# Altium footprint library qfuse_pcb_lib.PcbLib: 37 footprints (part 2 of 3)
Each footprint in its own frame and in the unit in brackets; x right, y up, seen from the top. Pads: shape width x height; smd on the part's side, far side on the other; paste and mask are expansions set on the pad; w line width, h text height; cw(c..) or ccw(c..) is an arc to the next point about the centre after c.
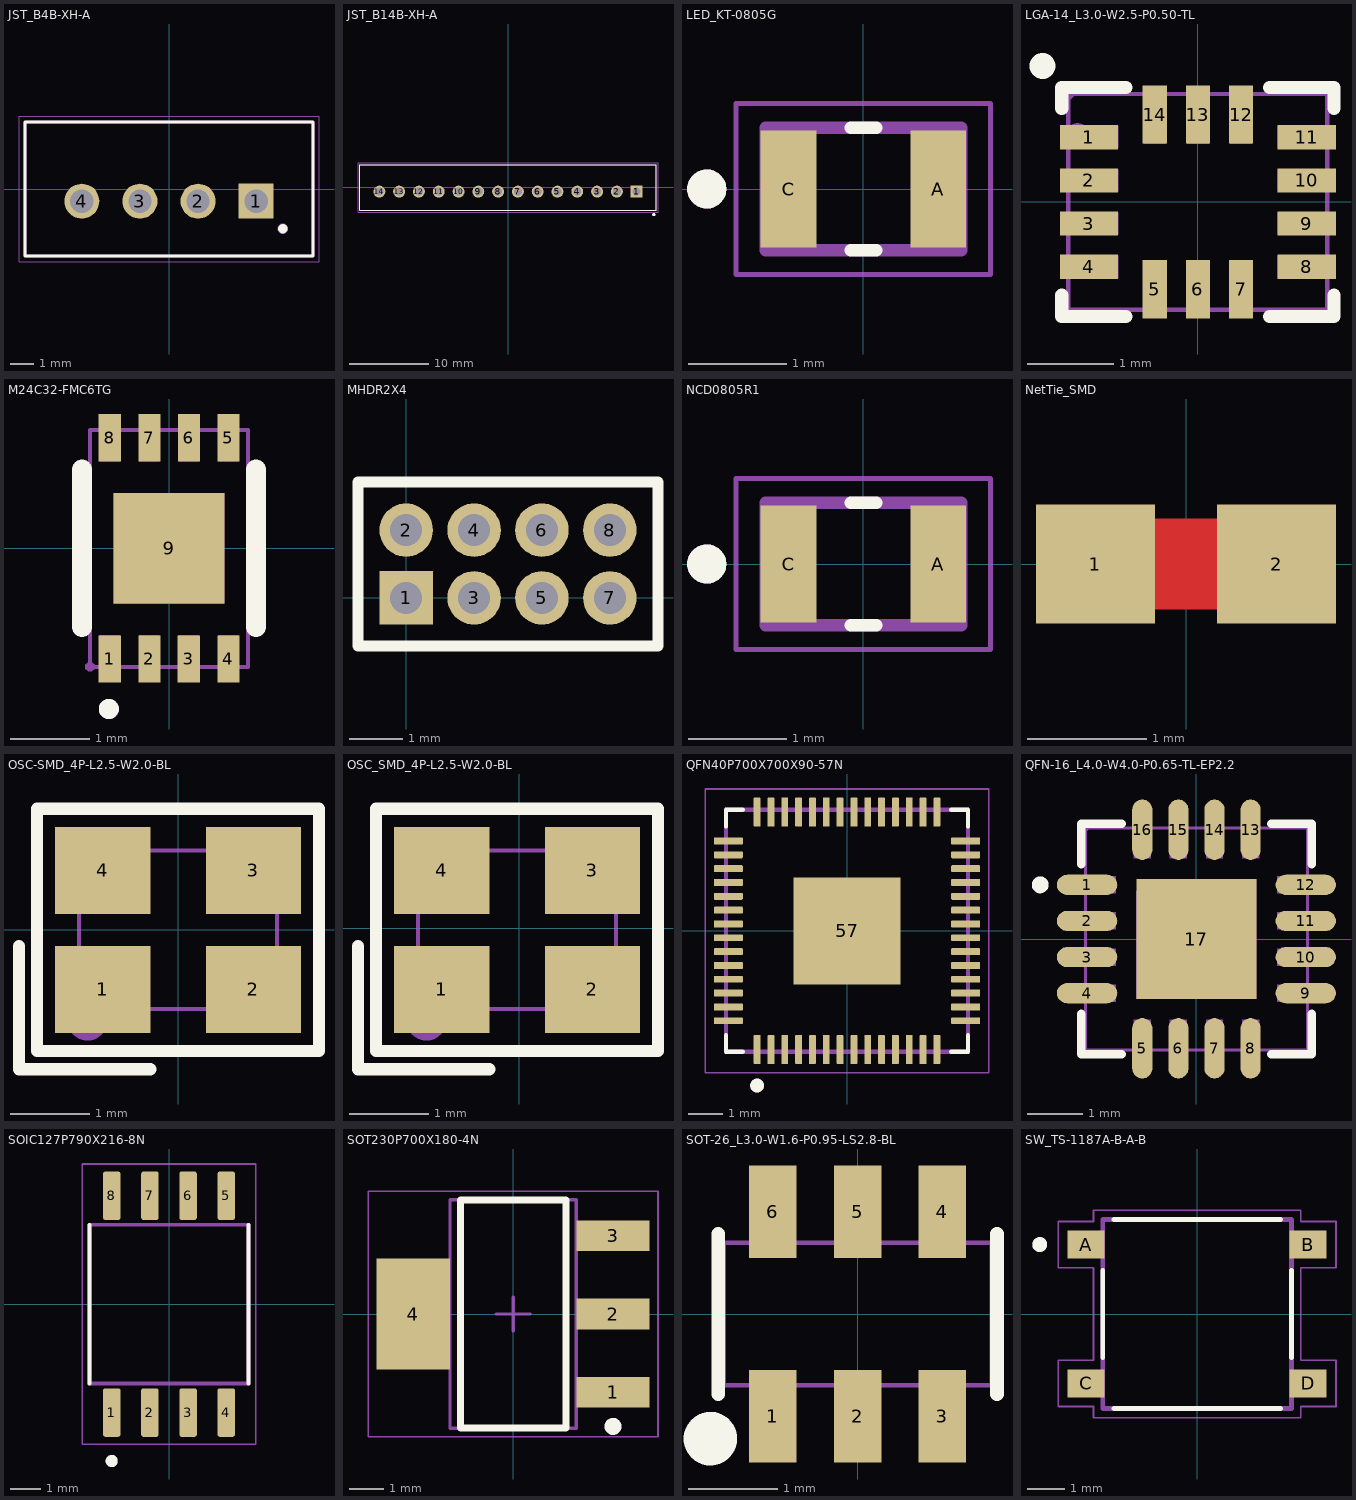
[diagram p1: the footprints below, top view; thin cyan lines are the x and y axes]

## JST_B4B-XH-A [mm] "JST 4 Pin Single Row Header"
height 7
pads (4):
  rect 1.508x1.508 / inner round 1.508 / far side rect 1.508x1.508 hole 1: 1(3.75,-0.525)
  round 1.508 hole 1: 2(1.25,-0.525) 3(-1.25,-0.525) 4(-3.75,-0.525)
Top Overlay:
  circle w0.2: c4.894,-1.706 r0.1
  lines w0.127: -6.2,-2.875 -6.2,2.875 6.2,2.875 6.2,-2.875 -6.2,-2.875
Mechanical 13:
  circle w0.2: c4.894,-1.706 r0.127
  lines w0.127: -6.2,-2.875 -6.2,2.875 6.2,2.875 6.2,-2.875 -6.2,-2.875
Mechanical 15:
  lines w0.05: -6.45,-3.125 -6.45,3.125 6.45,3.125 6.45,-3.125 -6.45,-3.125
3D body "step_temp.STEP": height 7, standoff -3.4, extent -6.2,-2.875 6.2,2.875

## JST_B14B-XH-A [mm] "JST 14 Pin Single Row Header"
height 7
pads (14):
  rect 1.508x1.508 / inner round 1.508 / far side rect 1.508x1.508 hole 1: 1(16.25,-0.525)
  round 1.508 hole 1: 2(13.75,-0.525) 3(11.25,-0.525) 4(8.75,-0.525) 5(6.25,-0.525) 6(3.75,-0.525) 7(1.25,-0.525) 8(-1.25,-0.525) 9(-3.75,-0.525) 10(-6.25,-0.525) 11(-8.75,-0.525) 12(-11.25,-0.525) 13(-13.75,-0.525) 14(-16.25,-0.525)
Top Overlay:
  circle w0.2: c18.415,-3.429 r0.1
  lines w0.127: -18.7,-2.875 18.7,-2.875 18.7,2.875 -18.7,2.875 -18.7,-2.875
Mechanical 13:
  circle w0.2: c18.415,-3.429 r0.1
  lines w0.127: -18.7,-2.875 18.7,-2.875 18.7,2.875 -18.7,2.875 -18.7,-2.875
Mechanical 15:
  lines w0.05: -18.95,-3.125 18.95,-3.125 18.95,3.125 -18.95,3.125 -18.95,-3.125
3D body "step_temp.STEP": height 7, standoff -3.4, extent -18.7,-2.875 18.7,2.875

## LED_KT-0805G [mm]
height 0.8
pads (2):
  rect 0.57x1.2 smd: A(0.765,0) C(-0.765,0)
Top Overlay:
  circle w0.2: c-1.6,0 r0.1
  lines w0.127: -0.13,-0.625 0.13,-0.625 ; -0.13,0.625 0.13,0.625
Mechanical 13:
  circle w0.2: c-1.6,0 r0.1
  lines w0.127: -1,-0.625 1,-0.625 1,0.625 -1,0.625 -1,-0.625
Mechanical 15:
  lines w0.05: -1.3,-0.875 1.3,-0.875 1.3,0.875 -1.3,0.875 -1.3,-0.875
3D body "step_temp.STEP": height 0.8, standoff 0, extent -1,-0.625 1,0.625

## LGA-14_L3.0-W2.5-P0.50-TL [mm]
pads (14):
  rect 0.675x0.28 smd paste+0 mask+0.051: 1(-1.262,0.75) 2(-1.262,0.25) 3(-1.262,-0.25) 4(-1.262,-0.75) 8(1.262,-0.75) 9(1.262,-0.25) 10(1.262,0.25) 11(1.262,0.75)
  rect 0.28x0.675 smd paste+0 mask+0.051: 5(-0.5,-1.012) 6(0,-1.012) 7(0.5,-1.012) 12(0.5,1.012) 13(0,1.012) 14(-0.5,1.012)
Top Overlay:
  circle w0.15: c-1.8,1.575 r0.075
  lines w0.152: -1.576,-1.08 -1.576,-1.326 -0.831,-1.326 ; -1.576,1.08 -1.576,1.326 -0.831,1.326 ; 0.83,-1.326 1.576,-1.326 1.576,-1.08 ; 0.83,1.326 1.576,1.326 1.576,1.08
Mechanical 6:
  circle w0.15: c-1.397,0.762 r0.075
Mechanical 15:
  region: -1.4,0.875 -0.925,0.875 -0.925,0.625 -1.4,0.625
  region: -1.4,0.375 -0.925,0.375 -0.925,0.125 -1.4,0.125
  region: -1.4,-0.125 -0.925,-0.125 -0.925,-0.375 -1.4,-0.375
  region: -1.4,-0.625 -0.925,-0.625 -0.925,-0.875 -1.4,-0.875
  region: -0.625,-0.675 -0.375,-0.675 -0.375,-1.15 -0.625,-1.15
  region: -0.125,-0.675 0.125,-0.675 0.125,-1.15 -0.125,-1.15
  region: 0.375,-0.675 0.625,-0.675 0.625,-1.15 0.375,-1.15
  region: 0.925,-0.625 1.4,-0.625 1.4,-0.875 0.925,-0.875
  region: 0.925,-0.125 1.4,-0.125 1.4,-0.375 0.925,-0.375
  region: 0.925,0.375 1.4,0.375 1.4,0.125 0.925,0.125
  region: 0.925,0.875 1.4,0.875 1.4,0.625 0.925,0.625
  region: 0.375,1.15 0.625,1.15 0.625,0.675 0.375,0.675
  region: -0.125,1.15 0.125,1.15 0.125,0.675 -0.125,0.675
  region: -0.625,1.15 -0.375,1.15 -0.375,0.675 -0.625,0.675
  region: -1.44,1.25 -1.44,1.275 -1.475,1.31 -1.525,1.31 -1.56,1.275 -1.56,1.25 -1.56,1.225 -1.525,1.19 -1.475,1.19 -1.44,1.225
  lines w0.051: -1.5,-1.25 -1.5,1.25 1.5,1.25 1.5,-1.25 -1.5,-1.25
3D body "LGA14_2P5X3X0P91_TDK.step": height 0.97, standoff 0, extent -1.499,-1.245 1.499,1.245

## M24C32-FMC6TG [mm]
pads (9):
  rect 0.28x0.6 smd mask+0.05: 1(-0.75,-1.399) 2(-0.248,-1.399) 3(0.25,-1.399) 4(0.752,-1.399) 5(0.752,1.401) 6(0.251,1.401) 7(-0.248,1.401) 8(-0.75,1.401)
  rect 1.4x1.4 smd: 9(0,0)
Top Overlay:
  circle w0.127: c-0.762,-2.032 r0.064
  lines w0.254: -1.1,-0.997 -1.1,0.997 ; 1.1,-0.995 1.1,0.999
Mechanical 6:
  circle w0.127: c-0.762,-2.032 r0.064
Mechanical 15:
  region: -0.625,-1.499 -0.875,-1.499 -0.875,-1.099 -0.625,-1.099
  region: -0.123,-1.499 -0.373,-1.499 -0.373,-1.099 -0.123,-1.099
  region: 0.375,-1.499 0.125,-1.499 0.125,-1.099 0.375,-1.099
  region: 0.877,-1.499 0.627,-1.499 0.627,-1.099 0.877,-1.099
  region: 0.877,1.101 0.627,1.101 0.627,1.501 0.877,1.501
  region: 0.376,1.101 0.126,1.101 0.126,1.501 0.376,1.501
  region: -0.123,1.101 -0.373,1.101 -0.373,1.501 -0.123,1.501
  region: -0.625,1.101 -0.875,1.101 -0.875,1.501 -0.625,1.501
  region: 0.7,0.7 0.7,-0.7 -0.7,-0.7 -0.7,0.7
  region: -0.939,-1.499 -0.94,-1.474 -0.975,-1.44 -1.024,-1.44 -1.059,-1.474 -1.059,-1.499 -1.059,-1.523 -1.024,-1.558 -0.975,-1.558 -0.94,-1.523
  lines w0.051: -0.999,-1.499 1.001,-1.499 1.001,1.501 -0.999,1.501 -0.999,-1.499
3D body "DFPN_MC6TG_STM.step": height 0.61, standoff 0, extent -1.013,-1.549 0.993,1.549

## MHDR2X4 [mm] "Connector; Header; 4x2 Position"
pads (8):
  rect 1x1 hole 0.6: 1(0,0)
  round 1 hole 0.6: 2(0,1.27) 3(1.27,0) 4(1.27,1.27) 5(2.54,0) 6(2.54,1.27) 7(3.81,0) 8(3.81,1.27)
Top Overlay:
  lines w0.2: -0.9,-0.9 4.71,-0.9 4.71,2.17 -0.9,2.17 -0.9,-0.9

## NCD0805R1 [mm]
height 0.8
pads (2):
  rect 0.57x1.2 smd: A(0.765,0) C(-0.765,0)
Top Overlay:
  circle w0.2: c-1.6,0 r0.1
  lines w0.127: -0.13,-0.625 0.13,-0.625 ; -0.13,0.625 0.13,0.625
Mechanical 13:
  circle w0.2: c-1.6,0 r0.1
  lines w0.127: -1,-0.625 -1,0.625 1,0.625 1,-0.625 -1,-0.625
Mechanical 15:
  lines w0.05: -1.3,-0.875 -1.3,0.875 1.3,0.875 1.3,-0.875 -1.3,-0.875
3D body "step_temp.STEP": height 0.8, standoff 0, extent -1,-0.625 1,0.625

## NetTie_SMD [mm]
pads (2):
  rect 1x1 smd mask-10: 1(-0.762,0) 2(0.762,0)
Top Layer:
  rectangle: -0.381,-0.381 0.381,0.381

## OSC-SMD_4P-L2.5-W2.0-BL [mm]
pads (4):
  rect 1.2x1.1 smd paste+0 mask+0.051: 1(-0.95,-0.75) 2(0.95,-0.75) 3(0.95,0.75) 4(-0.95,0.75)
Top Overlay:
  lines w0.152: -2.007,-0.201 -2.007,-1.758 -0.351,-1.758 ; -1.779,-1.529 -1.779,1.529 1.779,1.529 1.779,-1.529 -1.779,-1.529
Mechanical 6:
  circle w0.254: c-1.143,-1.143 r0.127
  region: -1.143,0.635 -0.635,0.635 -0.635,0.508 -1.143,0.508
  region: -0.953,0.318 -0.953,0.826 -0.826,0.826 -0.826,0.318
  region: 0.635,-0.635 1.143,-0.635 1.143,-0.762 0.635,-0.762
Mechanical 15:
  region: -1.19,-1 -1.19,-0.976 -1.225,-0.941 -1.274,-0.941 -1.309,-0.976 -1.31,-1 -1.309,-1.024 -1.274,-1.059 -1.225,-1.059 -1.19,-1.024
  region: -1.25,1 -0.45,1 -0.45,0.325 -1.25,0.325
  region: -0.45,-1 -1.25,-1 -1.25,-0.325 -0.45,-0.325
  region: 1.25,0.325 0.45,0.325 0.45,1 1.25,1
  region: 1.25,-1 0.45,-1 0.45,-0.325 1.25,-0.325
  lines w0.051: -1.25,-1 -1.25,1 1.25,1 1.25,-1 -1.25,-1
3D body "2520 SMD Crystal Oscillator.STEP": height 0.65, standoff -0.05, extent -1.25,-1 1.25,1

## OSC_SMD_4P-L2.5-W2.0-BL [mm]
pads (4):
  rect 1.2x1.1 smd paste+0 mask+0.051: 1(-0.975,-0.77) 2(0.925,-0.77) 3(0.925,0.73) 4(-0.975,0.73)
Top Overlay:
  lines w0.152: -2.032,-0.221 -2.032,-1.778 -0.376,-1.778 ; -1.804,-1.549 1.753,-1.549 1.753,1.508 -1.804,1.508 -1.804,-1.549
Mechanical 6:
  circle w0.254: c-1.168,-1.163 r0.127
  region: 0.61,-0.655 1.118,-0.655 1.118,-0.782 0.61,-0.782
  region: -0.978,0.297 -0.978,0.805 -0.851,0.805 -0.851,0.297
  region: -1.168,0.615 -0.66,0.615 -0.66,0.488 -1.168,0.488
Mechanical 15:
  region: 1.225,-1.02 0.425,-1.02 0.425,-0.345 1.225,-0.345
  region: 1.225,0.305 0.425,0.305 0.425,0.98 1.225,0.98
  region: -0.475,-1.02 -1.275,-1.02 -1.275,-0.345 -0.475,-0.345
  region: -1.275,0.98 -0.475,0.98 -0.475,0.305 -1.275,0.305
  region: -1.215,-1.02 -1.216,-0.996 -1.251,-0.962 -1.3,-0.962 -1.335,-0.996 -1.335,-1.02 -1.335,-1.045 -1.3,-1.079 -1.251,-1.079 -1.216,-1.045
  lines w0.051: -1.275,-1.02 1.225,-1.02 1.225,0.98 -1.275,0.98 -1.275,-1.02
3D body "2520 SMD Crystal Oscillator.STEP": height 0.65, standoff -0.05, extent -1.275,-1.025 1.225,0.975

## QFN40P700X700X90-57N [mm]
pads (57):
  rrect25% 0.2x0.84 smd: 1(-2.6,-3.435) 2(-2.2,-3.435) 3(-1.8,-3.435) 4(-1.4,-3.435) 5(-1,-3.435) 6(-0.6,-3.435) 7(-0.2,-3.435) 8(0.2,-3.435) 9(0.6,-3.435) 10(1,-3.435) 11(1.4,-3.435) 12(1.8,-3.435) 13(2.2,-3.435) 14(2.6,-3.435) 29(2.6,3.435) 30(2.2,3.435) 31(1.8,3.435) 32(1.4,3.435) 33(1,3.435) 34(0.6,3.435) 35(0.2,3.435) 36(-0.2,3.435) 37(-0.6,3.435) 38(-1,3.435) 39(-1.4,3.435) 40(-1.8,3.435) 41(-2.2,3.435) 42(-2.6,3.435)
  rrect25% 0.84x0.2 smd: 15(3.435,-2.6) 16(3.435,-2.2) 17(3.435,-1.8) 18(3.435,-1.4) 19(3.435,-1) 20(3.435,-0.6) 21(3.435,-0.2) 22(3.435,0.2) 23(3.435,0.6) 24(3.435,1) 25(3.435,1.4) 26(3.435,1.8) 27(3.435,2.2) 28(3.435,2.6) 43(-3.435,2.6) 44(-3.435,2.2) 45(-3.435,1.8) 46(-3.435,1.4) 47(-3.435,1) 48(-3.435,0.6) 49(-3.435,0.2) 50(-3.435,-0.2) 51(-3.435,-0.6) 52(-3.435,-1) 53(-3.435,-1.4) 54(-3.435,-1.8) 55(-3.435,-2.2) 56(-3.435,-2.6)
  rect 3.1x3.1 smd paste-0.57: 57(0,0)
Top Overlay:
  circle w0.2: c-2.6,-4.475 r0.1
  lines w0.127: -3.5,-3.02 -3.5,-3.5 -3.02,-3.5 ; -3.5,3.02 -3.5,3.5 -3.02,3.5 ; 3.02,-3.5 3.5,-3.5 3.5,-3.02 ; 3.02,3.5 3.5,3.5 3.5,3.02
Mechanical 13:
  circle w0.2: c-2.6,-4.475 r0.1
  lines w0.127: -3.5,-3.5 -3.5,3.5 3.5,3.5 3.5,-3.5 -3.5,-3.5
Mechanical 15:
  lines w0.05: -4.105,-4.105 -4.105,4.105 4.105,4.105 4.105,-4.105 -4.105,-4.105
3D body "RP2040--3DModel-STEP-269445.STEP": height 0.9, standoff 0, extent -3.5,-3.5 3.5,3.5

## QFN-16_L4.0-W4.0-P0.65-TL-EP2.2 [mil]
pads (17):
  oval 42.8x14.33 smd paste+0 mask+2: 1(-77.5,38.39) 2(-77.5,12.79) 3(-77.5,-12.8) 4(-77.5,-38.39) 9(77.5,-38.39) 10(77.5,-12.8) 11(77.5,12.79) 12(77.5,38.39)
  oval 14.33x42.8 smd paste+0 mask+2: 5(-38.39,-77.5) 6(-12.79,-77.5) 7(12.8,-77.5) 8(38.39,-77.5) 13(38.39,77.5) 14(12.8,77.5) 15(-12.79,77.5) 16(-38.39,77.5)
  rect 85.04x85.04 smd paste+0 mask+2: 17(0,0)
Top Overlay:
  circle w6: c-110.71,38.39 r3
  lines w6: -81.74,-53.05 -81.74,-81.74 -53.05,-81.74 ; -81.74,53.05 -81.74,81.74 -53.05,81.74 ; 53.05,-81.74 81.74,-81.74 81.74,-53.05 ; 53.05,81.74 81.74,81.74 81.74,53.05
Mechanical 6:
  circle w6: c-90.55,38.39 r3
Mechanical 15:
  region: -76.38,78.74 -76.4,79.7 -77.77,81.05 -79.7,81.05 -81.08,79.71 -81.1,78.74 -81.08,77.78 -79.7,76.43 -77.78,76.43 -76.4,77.78
  region: -78.74,44.39 -57.09,44.39 -57.09,32.38 -78.74,32.38
  region: -78.74,18.8 -57.09,18.8 -57.09,6.79 -78.74,6.79
  region: -78.74,-6.79 -57.09,-6.79 -57.09,-18.8 -78.74,-18.8
  region: -78.74,-32.38 -57.09,-32.38 -57.09,-44.39 -78.74,-44.39
  region: -44.39,-57.09 -32.38,-57.09 -32.38,-78.74 -44.39,-78.74
  region: -18.8,-57.09 -6.79,-57.09 -6.79,-78.74 -18.8,-78.74
  region: 6.79,-57.09 18.8,-57.09 18.8,-78.74 6.79,-78.74
  region: 32.38,-57.09 44.39,-57.09 44.39,-78.74 32.38,-78.74
  region: 78.74,-32.38 57.09,-32.38 57.09,-44.39 78.74,-44.39
  region: 78.74,-6.79 57.09,-6.79 57.09,-18.8 78.74,-18.8
  region: 78.74,18.8 57.09,18.8 57.09,6.79 78.74,6.79
  region: 78.74,44.39 57.09,44.39 57.09,32.38 78.74,32.38
  region: 32.38,57.09 44.39,57.09 44.39,78.74 32.38,78.74
  region: 6.79,57.09 18.8,57.09 18.8,78.74 6.79,78.74
  region: -18.8,57.09 -6.79,57.09 -6.79,78.74 -18.8,78.74
  region: -44.39,57.09 -32.38,57.09 -32.38,78.74 -44.39,78.74
  region: -34.02,42.52 42.52,42.52 42.52,-42.52 -42.52,-42.52 -42.52,34.02
  lines w2: -78.74,-78.74 78.74,-78.74 78.74,78.74 -78.74,78.74 -78.74,-78.74
3D body "RGV0016A.stp": height 39.37, standoff 0, extent -78.74,-78.74 78.74,78.74

## SOIC127P790X216-8N [mm]
pads (8):
  rrect25% 0.58x1.61 smd: 1(-1.905,-3.605) 2(-0.635,-3.605) 3(0.635,-3.605) 4(1.905,-3.605) 5(1.905,3.605) 6(0.635,3.605) 7(-0.635,3.605) 8(-1.905,3.605)
Top Overlay:
  circle w0.2: c-1.905,-5.215 r0.1
  lines w0.127: -2.64,-2.64 -2.64,2.64 ; 2.64,-2.64 2.64,2.64
Mechanical 13:
  circle w0.2: c-1.905,-5.215 r0.1
  lines w0.127: -2.64,-2.64 -2.64,2.64 2.64,2.64 2.64,-2.64 -2.64,-2.64
Mechanical 15:
  lines w0.05: -2.89,-4.66 -2.89,4.66 2.89,4.66 2.89,-4.66 -2.89,-4.66
3D body "SOIC_208MIL_WIN.step": height 2.16, standoff 0, extent -2.692,-4.051 2.692,4.051

## SOT230P700X180-4N [mm] "SOT223, 4-Leads, Body 6.51x7.00mm (avg), Pitch 2.30mm, IPC Medium Density"
height 1.8
pads (4):
  rect 2.15x0.9 smd: 1(2.93,-2.3) 2(2.93,0) 3(2.93,2.3)
  rect 2.15x3.25 smd: 4(-2.93,0)
Top Overlay:
  circle w0.25: c2.93,-3.3 r0.125
  lines w0.2: -1.55,-3.35 -1.55,3.35 1.55,3.35 1.55,-3.35 -1.55,-3.35
Mechanical 13:
  lines w0.1: -1.855,-3.355 -1.855,3.355 1.855,3.355 1.855,-3.355 -1.855,-3.355
Mechanical 15:
  lines w0.05: -4.25,-3.6 -4.25,3.6 4.25,3.6 4.25,-3.6 -4.25,-3.6
  lines w0.1: -0.5,0 0.5,0 ; 0,-0.5 0,0.5
3D body: height 1.8, standoff 0.02, extent -1.855,-3.355 1.855,3.355

## SOT-26_L3.0-W1.6-P0.95-LS2.8-BL [mm]
pads (6):
  rect 0.532x1.04 smd paste+0 mask+0.051: 1(-0.95,-1.145) 2(0,-1.145) 3(0.95,-1.145) 4(0.95,1.145) 5(0,1.145) 6(-0.95,1.145)
Top Overlay:
  circle w0.3: c-1.651,-1.397 r0.15
  lines w0.152: -1.561,-0.901 -1.561,0.901 ; 1.561,-0.901 1.561,0.901
Mechanical 6:
  circle w0.2: c-1.651,-1.397 r0.1
Mechanical 15:
  region: 1.15,0.75 0.75,0.75 0.75,1.035 1.15,1.035
  region: 0.2,0.75 -0.2,0.75 -0.2,1.035 0.2,1.035
  region: -0.75,0.75 -1.15,0.75 -1.15,1.035 -0.75,1.035
  region: -1.15,-0.75 -0.75,-0.75 -0.75,-1.035 -1.15,-1.035
  region: -0.2,-0.75 0.2,-0.75 0.2,-1.035 -0.2,-1.035
  region: -1.15,1.025 -0.75,1.025 -0.75,1.425 -1.15,1.425
  region: -0.2,1.025 0.2,1.025 0.2,1.425 -0.2,1.425
  region: 0.75,1.025 1.15,1.025 1.15,1.425 0.75,1.425
  region: 0.75,-0.75 1.15,-0.75 1.15,-1.035 0.75,-1.035
  region: 0.75,-1.025 1.15,-1.025 1.15,-1.425 0.75,-1.425
  region: -0.2,-1.025 0.2,-1.025 0.2,-1.425 -0.2,-1.425
  region: -1.15,-1.025 -0.75,-1.025 -0.75,-1.425 -1.15,-1.425
  region: -1.425,-1.425 -1.425,-1.4 -1.46,-1.366 -1.509,-1.366 -1.544,-1.4 -1.545,-1.425 -1.544,-1.449 -1.509,-1.484 -1.46,-1.484 -1.425,-1.449
  lines w0.051: -1.5,-0.8 -1.5,0.8 1.5,0.8 1.5,-0.8 -1.5,-0.8
3D body "SOT26_DIO.step": height 1.3, standoff 0, extent -1.55,-1.25 1.55,1.25

## SW_TS-1187A-B-A-B [mm]
pads (4):
  rect 1x0.75 smd: A(-3,1.875) B(3,1.875) C(-3,-1.875) D(3,-1.875)
Top Overlay:
  circle w0.2: c-4.25,1.875 r0.1
  lines w0.127: -2.55,-1.18 -2.55,1.18 ; -2.25,-2.55 2.25,-2.55 ; -2.25,2.55 2.25,2.55 ; 2.55,-1.18 2.55,1.18
Mechanical 13:
  circle w0.2: c-4.25,1.875 r0.1
  lines w0.127: -2.55,-2.55 -2.55,2.55 2.55,2.55 2.55,-2.55 -2.55,-2.55
Mechanical 15:
  lines w0.05: -3.75,-2.5 -3.75,-1.25 -2.8,-1.25 -2.8,1.25 -3.75,1.25 -3.75,2.5 -2.8,2.5 -2.8,2.8 2.8,2.8 2.8,2.5 3.75,2.5 3.75,1.25 2.8,1.25 2.8,-1.25 3.75,-1.25 3.75,-2.5 2.8,-2.5 2.8,-2.8 -2.8,-2.8 -2.8,-2.5 -3.75,-2.5
3D body "TS-1187A-B-A-B--3DModel-STEP-56544.STEP": height 1.55, standoff 0, extent -3.25,-2.55 3.25,2.55